# Altium footprint library con-molex.PCBLIB: 368 footprints (part 9 of 26) (continued)
## 52760-0479 [mm] (continued)
  region: -5.247,3.1 -5.548,3.1 -5.548,2.375 -5.247,2.375
  rectangle: -4.913,-3.1 -4.612,-2.375
  region: -4.612,3.1 -4.913,3.1 -4.913,2.375 -4.612,2.375
  rectangle: -4.278,-3.1 -3.977,-2.375
  region: -3.977,3.1 -4.278,3.1 -4.278,2.375 -3.977,2.375
  rectangle: -3.643,-3.1 -3.342,-2.375
  region: -3.342,3.1 -3.643,3.1 -3.643,2.375 -3.342,2.375
  rectangle: -3.008,-3.1 -2.707,-2.375
  region: -2.707,3.1 -3.008,3.1 -3.008,2.375 -2.707,2.375
  rectangle: -2.373,-3.1 -2.072,-2.375
  region: -2.072,3.1 -2.373,3.1 -2.373,2.375 -2.072,2.375
  rectangle: -1.738,-3.1 -1.437,-2.375
  region: -1.437,3.1 -1.738,3.1 -1.738,2.375 -1.437,2.375
  rectangle: -1.103,-3.1 -0.802,-2.375
  region: -0.802,3.1 -1.103,3.1 -1.103,2.375 -0.802,2.375
  rectangle: -0.468,-3.1 -0.167,-2.375
  region: -0.167,3.1 -0.468,3.1 -0.468,2.375 -0.167,2.375
  rectangle: 0.167,-3.1 0.468,-2.375
  region: 0.468,3.1 0.167,3.1 0.167,2.375 0.468,2.375
  rectangle: 0.802,-3.1 1.103,-2.375
  region: 1.103,3.1 0.802,3.1 0.802,2.375 1.103,2.375
  rectangle: 1.437,-3.1 1.738,-2.375
  region: 1.738,3.1 1.437,3.1 1.437,2.375 1.738,2.375
  rectangle: 2.072,-3.1 2.373,-2.375
  region: 2.373,3.1 2.072,3.1 2.072,2.375 2.373,2.375
  rectangle: 2.707,-3.1 3.008,-2.375
  region: 3.008,3.1 2.707,3.1 2.707,2.375 3.008,2.375
  rectangle: 3.342,-3.1 3.643,-2.375
  region: 3.643,3.1 3.342,3.1 3.342,2.375 3.643,2.375
  rectangle: 3.977,-3.1 4.278,-2.375
  region: 4.278,3.1 3.977,3.1 3.977,2.375 4.278,2.375
  rectangle: 4.612,-3.1 4.913,-2.375
  region: 4.913,3.1 4.612,3.1 4.612,2.375 4.913,2.375
  rectangle: 5.247,-3.1 5.548,-2.375
  region: 5.548,3.1 5.247,3.1 5.247,2.375 5.548,2.375
  rectangle: 5.882,-3.1 6.183,-2.375
  region: 6.183,3.1 5.882,3.1 5.882,2.375 6.183,2.375
  lines w0.203: -9.6,-1.5 -9.6,1.5 ; -8.2,-2.4 8.2,-2.4 ; -8.2,2.4 8.2,2.4 ; -6.6,-2 6.6,-2 ; -6.6,-1 6.6,-1 ; -6.6,1 6.6,1 ; -6.6,2 6.6,2 ; 9.6,-1.5 9.6,1.5

## 52760-0579 [mm]
pads (54):
  round 0.9 hole 0.9: 1(-9.273,0)
  rect 0.35x2.5 smd: 1(-7.62,-2.35) 2(-7.62,2.35) 3(-6.985,-2.35) 4(-6.985,2.35) 5(-6.35,-2.35) 6(-6.35,2.35) 7(-5.715,-2.35) 8(-5.715,2.35) 9(-5.08,-2.35) 10(-5.08,2.35) 11(-4.445,-2.35) 12(-4.445,2.35) 13(-3.81,-2.35) 14(-3.81,2.35) 15(-3.175,-2.35) 16(-3.175,2.35) 17(-2.54,-2.35) 18(-2.54,2.35) 19(-1.905,-2.35) 20(-1.905,2.35) 21(-1.27,-2.35) 22(-1.27,2.35) 23(-0.635,-2.35) 24(-0.635,2.35) 25(0,-2.35) 26(0,2.35) 27(0.635,-2.35) 28(0.635,2.35) 29(1.27,-2.35) 30(1.27,2.35) 31(1.905,-2.35) 32(1.905,2.35) 33(2.54,-2.35) 34(2.54,2.35) 35(3.175,-2.35) 36(3.175,2.35) 37(3.81,-2.35) 38(3.81,2.35) 39(4.445,-2.35) 40(4.445,2.35) 41(5.08,-2.35) 42(5.08,2.35) 43(5.715,-2.35) 44(5.715,2.35) 45(6.35,-2.35) 46(6.35,2.35) 47(6.985,-2.35) 48(6.985,2.35) 49(7.62,-2.35) 50(7.62,2.35)
  round 0.7 hole 0.7: 1(9.273,0)
  rect 2.5x2 smd: M1(-11.312,0) M2(11.312,0)
Top Overlay:
  lines w0.203: -11.187,-1.5 -11.787,-1.5 -11.787,-1.9 -10.587,-3.1 -9.787,-3.1 -9.787,-2.4 ; -11.187,1.5 -11.787,1.5 -11.787,3.1 -9.787,3.1 -9.787,2.4 ; -8.187,-2 -9.937,-2 -9.937,0 -9.187,0 -9.187,2 -8.187,2 ; -8.187,-1 cw(c-8.188,-0.75) -8.438,-0.75 -8.438,0.75 cw(c-8.188,0.75) -8.187,1 ; 8.187,-2 9.937,-2 9.937,0 9.187,0 9.187,2 8.187,2 ; 8.187,-1 ccw(c8.188,-0.75) 8.438,-0.75 8.438,0.75 ccw(c8.188,0.75) 8.187,1 ; 9.787,-2.4 9.787,-3.1 11.787,-3.1 11.787,-1.5 11.187,-1.5 ; 9.787,2.4 9.787,3.1 11.787,3.1 11.787,1.5 11.187,1.5
Top Solder:
  rectangle: -7.82,-3.625 -7.42,-1.075
  region: -7.42,3.625 -7.82,3.625 -7.82,1.075 -7.42,1.075
  rectangle: -7.185,-3.625 -6.785,-1.075
  region: -6.785,3.625 -7.185,3.625 -7.185,1.075 -6.785,1.075
  rectangle: -6.55,-3.625 -6.15,-1.075
  region: -6.15,3.625 -6.55,3.625 -6.55,1.075 -6.15,1.075
  rectangle: -5.915,-3.625 -5.515,-1.075
  region: -5.515,3.625 -5.915,3.625 -5.915,1.075 -5.515,1.075
  rectangle: -5.28,-3.625 -4.88,-1.075
  region: -4.88,3.625 -5.28,3.625 -5.28,1.075 -4.88,1.075
  rectangle: -4.645,-3.625 -4.245,-1.075
  region: -4.245,3.625 -4.645,3.625 -4.645,1.075 -4.245,1.075
  rectangle: -4.01,-3.625 -3.61,-1.075
  region: -3.61,3.625 -4.01,3.625 -4.01,1.075 -3.61,1.075
  rectangle: -3.375,-3.625 -2.975,-1.075
  region: -2.975,3.625 -3.375,3.625 -3.375,1.075 -2.975,1.075
  rectangle: -2.74,-3.625 -2.34,-1.075
  region: -2.34,3.625 -2.74,3.625 -2.74,1.075 -2.34,1.075
  rectangle: -2.105,-3.625 -1.705,-1.075
  region: -1.705,3.625 -2.105,3.625 -2.105,1.075 -1.705,1.075
  rectangle: -1.47,-3.625 -1.07,-1.075
  region: -1.07,3.625 -1.47,3.625 -1.47,1.075 -1.07,1.075
  rectangle: -0.835,-3.625 -0.435,-1.075
  region: -0.435,3.625 -0.835,3.625 -0.835,1.075 -0.435,1.075
  rectangle: -0.2,-3.625 0.2,-1.075
  region: 0.2,3.625 -0.2,3.625 -0.2,1.075 0.2,1.075
  rectangle: 0.435,-3.625 0.835,-1.075
  region: 0.835,3.625 0.435,3.625 0.435,1.075 0.835,1.075
  rectangle: 1.07,-3.625 1.47,-1.075
  region: 1.47,3.625 1.07,3.625 1.07,1.075 1.47,1.075
  rectangle: 1.705,-3.625 2.105,-1.075
  region: 2.105,3.625 1.705,3.625 1.705,1.075 2.105,1.075
  rectangle: 2.34,-3.625 2.74,-1.075
  region: 2.74,3.625 2.34,3.625 2.34,1.075 2.74,1.075
  rectangle: 2.975,-3.625 3.375,-1.075
  region: 3.375,3.625 2.975,3.625 2.975,1.075 3.375,1.075
  rectangle: 3.61,-3.625 4.01,-1.075
  region: 4.01,3.625 3.61,3.625 3.61,1.075 4.01,1.075
  rectangle: 4.245,-3.625 4.645,-1.075
  region: 4.645,3.625 4.245,3.625 4.245,1.075 4.645,1.075
  rectangle: 4.88,-3.625 5.28,-1.075
  region: 5.28,3.625 4.88,3.625 4.88,1.075 5.28,1.075
  rectangle: 5.515,-3.625 5.915,-1.075
  region: 5.915,3.625 5.515,3.625 5.515,1.075 5.915,1.075
  rectangle: 6.15,-3.625 6.55,-1.075
  region: 6.55,3.625 6.15,3.625 6.15,1.075 6.55,1.075
  rectangle: 6.785,-3.625 7.185,-1.075
  region: 7.185,3.625 6.785,3.625 6.785,1.075 7.185,1.075
  rectangle: 7.42,-3.625 7.82,-1.075
  region: 7.82,3.625 7.42,3.625 7.42,1.075 7.82,1.075
Mechanical 16:
  rectangle: -7.77,-3.1 -7.47,-2.375
  region: -7.47,3.1 -7.77,3.1 -7.77,2.375 -7.47,2.375
  rectangle: -7.135,-3.1 -6.835,-2.375
  region: -6.835,3.1 -7.135,3.1 -7.135,2.375 -6.835,2.375
  rectangle: -6.5,-3.1 -6.2,-2.375
  region: -6.2,3.1 -6.5,3.1 -6.5,2.375 -6.2,2.375
  rectangle: -5.865,-3.1 -5.565,-2.375
  region: -5.565,3.1 -5.865,3.1 -5.865,2.375 -5.565,2.375
  rectangle: -5.23,-3.1 -4.93,-2.375
  region: -4.93,3.1 -5.23,3.1 -5.23,2.375 -4.93,2.375
  rectangle: -4.595,-3.1 -4.295,-2.375
  region: -4.295,3.1 -4.595,3.1 -4.595,2.375 -4.295,2.375
  rectangle: -3.96,-3.1 -3.66,-2.375
  region: -3.66,3.1 -3.96,3.1 -3.96,2.375 -3.66,2.375
  rectangle: -3.325,-3.1 -3.025,-2.375
  region: -3.025,3.1 -3.325,3.1 -3.325,2.375 -3.025,2.375
  rectangle: -2.69,-3.1 -2.39,-2.375
  region: -2.39,3.1 -2.69,3.1 -2.69,2.375 -2.39,2.375
  rectangle: -2.055,-3.1 -1.755,-2.375
  region: -1.755,3.1 -2.055,3.1 -2.055,2.375 -1.755,2.375
  rectangle: -1.42,-3.1 -1.12,-2.375
  region: -1.12,3.1 -1.42,3.1 -1.42,2.375 -1.12,2.375
  rectangle: -0.785,-3.1 -0.485,-2.375
  region: -0.485,3.1 -0.785,3.1 -0.785,2.375 -0.485,2.375
  rectangle: -0.15,-3.1 0.15,-2.375
  region: 0.15,3.1 -0.15,3.1 -0.15,2.375 0.15,2.375
  rectangle: 0.485,-3.1 0.785,-2.375
  region: 0.785,3.1 0.485,3.1 0.485,2.375 0.785,2.375
  rectangle: 1.12,-3.1 1.42,-2.375
  region: 1.42,3.1 1.12,3.1 1.12,2.375 1.42,2.375
  rectangle: 1.755,-3.1 2.055,-2.375
  region: 2.055,3.1 1.755,3.1 1.755,2.375 2.055,2.375
  rectangle: 2.39,-3.1 2.69,-2.375
  region: 2.69,3.1 2.39,3.1 2.39,2.375 2.69,2.375
  rectangle: 3.025,-3.1 3.325,-2.375
  region: 3.325,3.1 3.025,3.1 3.025,2.375 3.325,2.375
  rectangle: 3.66,-3.1 3.96,-2.375
  region: 3.96,3.1 3.66,3.1 3.66,2.375 3.96,2.375
  rectangle: 4.295,-3.1 4.595,-2.375
  region: 4.595,3.1 4.295,3.1 4.295,2.375 4.595,2.375
  rectangle: 4.93,-3.1 5.23,-2.375
  region: 5.23,3.1 4.93,3.1 4.93,2.375 5.23,2.375
  rectangle: 5.565,-3.1 5.865,-2.375
  region: 5.865,3.1 5.565,3.1 5.565,2.375 5.865,2.375
  rectangle: 6.2,-3.1 6.5,-2.375
  region: 6.5,3.1 6.2,3.1 6.2,2.375 6.5,2.375
  rectangle: 6.835,-3.1 7.135,-2.375
  region: 7.135,3.1 6.835,3.1 6.835,2.375 7.135,2.375
  rectangle: 7.47,-3.1 7.77,-2.375
  region: 7.77,3.1 7.47,3.1 7.47,2.375 7.77,2.375
  lines w0.203: -11.187,-1.5 -11.187,1.5 ; -9.787,-2.4 9.787,-2.4 ; -9.787,2.4 9.787,2.4 ; -8.187,-2 8.187,-2 ; -8.187,-1 8.187,-1 ; -8.187,1 8.187,1 ; -8.187,2 8.187,2 ; 11.187,-1.5 11.187,1.5

## 52760-0679 [mm]
pads (64):
  round 0.9 hole 0.9: 1(-10.86,0)
  rect 0.35x2.5 smd: 1(-9.207,-2.35) 2(-9.207,2.35) 3(-8.572,-2.35) 4(-8.572,2.35) 5(-7.938,-2.35) 6(-7.938,2.35) 7(-7.302,-2.35) 8(-7.302,2.35) 9(-6.667,-2.35) 10(-6.667,2.35) 11(-6.032,-2.35) 12(-6.032,2.35) 13(-5.397,-2.35) 14(-5.397,2.35) 15(-4.763,-2.35) 16(-4.763,2.35) 17(-4.127,-2.35) 18(-4.127,2.35) 19(-3.492,-2.35) 20(-3.492,2.35) 21(-2.857,-2.35) 22(-2.857,2.35) 23(-2.222,-2.35) 24(-2.222,2.35) 25(-1.587,-2.35) 26(-1.587,2.35) 27(-0.953,-2.35) 28(-0.953,2.35) 29(-0.318,-2.35) 30(-0.318,2.35) 31(0.318,-2.35) 32(0.318,2.35) 33(0.953,-2.35) 34(0.953,2.35) 35(1.587,-2.35) 36(1.587,2.35) 37(2.222,-2.35) 38(2.222,2.35) 39(2.857,-2.35) 40(2.857,2.35) 41(3.492,-2.35) 42(3.492,2.35) 43(4.127,-2.35) 44(4.127,2.35) 45(4.763,-2.35) 46(4.763,2.35) 47(5.397,-2.35) 48(5.397,2.35) 49(6.032,-2.35) 50(6.032,2.35) 51(6.667,-2.35) 52(6.667,2.35) 53(7.302,-2.35) 54(7.302,2.35) 55(7.938,-2.35) 56(7.938,2.35) 57(8.572,-2.35) 58(8.572,2.35) 59(9.207,-2.35) 60(9.207,2.35)
  round 0.7 hole 0.7: 1(10.86,0)
  rect 2.5x2 smd: M1(-12.9,0) M2(12.9,0)
Top Overlay:
  lines w0.203: -12.775,-1.5 -13.375,-1.5 -13.375,-1.9 -12.175,-3.1 -11.375,-3.1 -11.375,-2.4 ; -12.775,1.5 -13.375,1.5 -13.375,3.1 -11.375,3.1 -11.375,2.4 ; -9.775,-2 -11.525,-2 -11.525,0 -10.775,0 -10.775,2 -9.775,2 ; -9.775,-1 cw(c-9.775,-0.75) -10.025,-0.75 -10.025,0.75 cw(c-9.775,0.75) -9.775,1 ; 9.775,-2 11.525,-2 11.525,0 10.775,0 10.775,2 9.775,2 ; 9.775,-1 ccw(c9.775,-0.75) 10.025,-0.75 10.025,0.75 ccw(c9.775,0.75) 9.775,1 ; 11.375,-2.4 11.375,-3.1 13.375,-3.1 13.375,-1.5 12.775,-1.5 ; 11.375,2.4 11.375,3.1 13.375,3.1 13.375,1.5 12.775,1.5
Top Solder:
  rectangle: -9.407,-3.625 -9.008,-1.075
  region: -9.008,3.625 -9.407,3.625 -9.407,1.075 -9.008,1.075
  rectangle: -8.772,-3.625 -8.373,-1.075
  region: -8.373,3.625 -8.772,3.625 -8.772,1.075 -8.373,1.075
  rectangle: -8.137,-3.625 -7.738,-1.075
  region: -7.738,3.625 -8.137,3.625 -8.137,1.075 -7.738,1.075
  rectangle: -7.502,-3.625 -7.103,-1.075
  region: -7.103,3.625 -7.502,3.625 -7.502,1.075 -7.103,1.075
  rectangle: -6.867,-3.625 -6.468,-1.075
  region: -6.468,3.625 -6.867,3.625 -6.867,1.075 -6.468,1.075
  rectangle: -6.232,-3.625 -5.833,-1.075
  region: -5.833,3.625 -6.232,3.625 -6.232,1.075 -5.833,1.075
  rectangle: -5.597,-3.625 -5.198,-1.075
  region: -5.198,3.625 -5.597,3.625 -5.597,1.075 -5.198,1.075
  rectangle: -4.962,-3.625 -4.563,-1.075
  region: -4.563,3.625 -4.962,3.625 -4.962,1.075 -4.563,1.075
  rectangle: -4.327,-3.625 -3.928,-1.075
  region: -3.928,3.625 -4.327,3.625 -4.327,1.075 -3.928,1.075
  rectangle: -3.692,-3.625 -3.293,-1.075
  region: -3.293,3.625 -3.692,3.625 -3.692,1.075 -3.293,1.075
  rectangle: -3.057,-3.625 -2.658,-1.075
  region: -2.658,3.625 -3.057,3.625 -3.057,1.075 -2.658,1.075
  rectangle: -2.422,-3.625 -2.023,-1.075
  region: -2.023,3.625 -2.422,3.625 -2.422,1.075 -2.023,1.075
  rectangle: -1.787,-3.625 -1.388,-1.075
  region: -1.388,3.625 -1.787,3.625 -1.787,1.075 -1.388,1.075
  rectangle: -1.152,-3.625 -0.753,-1.075
  region: -0.753,3.625 -1.152,3.625 -1.152,1.075 -0.753,1.075
  rectangle: -0.517,-3.625 -0.118,-1.075
  region: -0.118,3.625 -0.517,3.625 -0.517,1.075 -0.118,1.075
  rectangle: 0.118,-3.625 0.517,-1.075
  region: 0.517,3.625 0.118,3.625 0.118,1.075 0.517,1.075
  rectangle: 0.753,-3.625 1.152,-1.075
  region: 1.152,3.625 0.753,3.625 0.753,1.075 1.152,1.075
  rectangle: 1.388,-3.625 1.787,-1.075
  region: 1.787,3.625 1.388,3.625 1.388,1.075 1.787,1.075
  rectangle: 2.023,-3.625 2.422,-1.075
  region: 2.422,3.625 2.023,3.625 2.023,1.075 2.422,1.075
  rectangle: 2.658,-3.625 3.057,-1.075
  region: 3.057,3.625 2.658,3.625 2.658,1.075 3.057,1.075
  rectangle: 3.293,-3.625 3.692,-1.075
  region: 3.692,3.625 3.293,3.625 3.293,1.075 3.692,1.075
  rectangle: 3.928,-3.625 4.327,-1.075
  region: 4.327,3.625 3.928,3.625 3.928,1.075 4.327,1.075
  rectangle: 4.563,-3.625 4.962,-1.075
  region: 4.962,3.625 4.563,3.625 4.563,1.075 4.962,1.075
  rectangle: 5.198,-3.625 5.597,-1.075
  region: 5.597,3.625 5.198,3.625 5.198,1.075 5.597,1.075
  rectangle: 5.833,-3.625 6.232,-1.075
  region: 6.232,3.625 5.833,3.625 5.833,1.075 6.232,1.075
  rectangle: 6.468,-3.625 6.867,-1.075
  region: 6.867,3.625 6.468,3.625 6.468,1.075 6.867,1.075
  rectangle: 7.103,-3.625 7.502,-1.075
  region: 7.502,3.625 7.103,3.625 7.103,1.075 7.502,1.075
  rectangle: 7.738,-3.625 8.137,-1.075
  region: 8.137,3.625 7.738,3.625 7.738,1.075 8.137,1.075
  rectangle: 8.373,-3.625 8.772,-1.075
  region: 8.772,3.625 8.373,3.625 8.373,1.075 8.772,1.075
  rectangle: 9.008,-3.625 9.407,-1.075
  region: 9.407,3.625 9.008,3.625 9.008,1.075 9.407,1.075
Mechanical 16:
  rectangle: -9.358,-3.1 -9.057,-2.375
  region: -9.057,3.1 -9.358,3.1 -9.358,2.375 -9.057,2.375
  rectangle: -8.723,-3.1 -8.422,-2.375
  region: -8.422,3.1 -8.723,3.1 -8.723,2.375 -8.422,2.375
  rectangle: -8.088,-3.1 -7.787,-2.375
  region: -7.787,3.1 -8.088,3.1 -8.088,2.375 -7.787,2.375
  rectangle: -7.453,-3.1 -7.152,-2.375
  region: -7.152,3.1 -7.453,3.1 -7.453,2.375 -7.152,2.375
  rectangle: -6.818,-3.1 -6.517,-2.375
  region: -6.517,3.1 -6.818,3.1 -6.818,2.375 -6.517,2.375
  rectangle: -6.183,-3.1 -5.882,-2.375
  region: -5.882,3.1 -6.183,3.1 -6.183,2.375 -5.882,2.375
  rectangle: -5.548,-3.1 -5.247,-2.375
  region: -5.247,3.1 -5.548,3.1 -5.548,2.375 -5.247,2.375
  rectangle: -4.913,-3.1 -4.612,-2.375
  region: -4.612,3.1 -4.913,3.1 -4.913,2.375 -4.612,2.375
  rectangle: -4.278,-3.1 -3.977,-2.375
  region: -3.977,3.1 -4.278,3.1 -4.278,2.375 -3.977,2.375
  rectangle: -3.643,-3.1 -3.342,-2.375
  region: -3.342,3.1 -3.643,3.1 -3.643,2.375 -3.342,2.375
  rectangle: -3.008,-3.1 -2.707,-2.375
  region: -2.707,3.1 -3.008,3.1 -3.008,2.375 -2.707,2.375
  rectangle: -2.373,-3.1 -2.072,-2.375
  region: -2.072,3.1 -2.373,3.1 -2.373,2.375 -2.072,2.375
  rectangle: -1.738,-3.1 -1.437,-2.375
  region: -1.437,3.1 -1.738,3.1 -1.738,2.375 -1.437,2.375
  rectangle: -1.103,-3.1 -0.802,-2.375
  region: -0.802,3.1 -1.103,3.1 -1.103,2.375 -0.802,2.375
  rectangle: -0.468,-3.1 -0.167,-2.375
  region: -0.167,3.1 -0.468,3.1 -0.468,2.375 -0.167,2.375
  rectangle: 0.167,-3.1 0.468,-2.375
  region: 0.468,3.1 0.167,3.1 0.167,2.375 0.468,2.375
  rectangle: 0.802,-3.1 1.103,-2.375
  region: 1.103,3.1 0.802,3.1 0.802,2.375 1.103,2.375
  rectangle: 1.437,-3.1 1.738,-2.375
  region: 1.738,3.1 1.437,3.1 1.437,2.375 1.738,2.375
  rectangle: 2.072,-3.1 2.373,-2.375
  region: 2.373,3.1 2.072,3.1 2.072,2.375 2.373,2.375
  rectangle: 2.707,-3.1 3.008,-2.375
  region: 3.008,3.1 2.707,3.1 2.707,2.375 3.008,2.375
  rectangle: 3.342,-3.1 3.643,-2.375
  region: 3.643,3.1 3.342,3.1 3.342,2.375 3.643,2.375
  rectangle: 3.977,-3.1 4.278,-2.375
  region: 4.278,3.1 3.977,3.1 3.977,2.375 4.278,2.375
  rectangle: 4.612,-3.1 4.913,-2.375
  region: 4.913,3.1 4.612,3.1 4.612,2.375 4.913,2.375
  rectangle: 5.247,-3.1 5.548,-2.375
  region: 5.548,3.1 5.247,3.1 5.247,2.375 5.548,2.375
  rectangle: 5.882,-3.1 6.183,-2.375
  region: 6.183,3.1 5.882,3.1 5.882,2.375 6.183,2.375
  rectangle: 6.517,-3.1 6.818,-2.375
  region: 6.818,3.1 6.517,3.1 6.517,2.375 6.818,2.375
  rectangle: 7.152,-3.1 7.453,-2.375
  region: 7.453,3.1 7.152,3.1 7.152,2.375 7.453,2.375
  rectangle: 7.787,-3.1 8.088,-2.375
  region: 8.088,3.1 7.787,3.1 7.787,2.375 8.088,2.375
  rectangle: 8.422,-3.1 8.723,-2.375
  region: 8.723,3.1 8.422,3.1 8.422,2.375 8.723,2.375
  rectangle: 9.057,-3.1 9.358,-2.375
  region: 9.358,3.1 9.057,3.1 9.057,2.375 9.358,2.375
  lines w0.203: -12.775,-1.5 -12.775,1.5 ; -11.375,-2.4 11.375,-2.4 ; -11.375,2.4 11.375,2.4 ; -9.775,-2 9.775,-2 ; -9.775,-1 9.775,-1 ; -9.775,1 9.775,1 ; -9.775,2 9.775,2 ; 12.775,-1.5 12.775,1.5

## 52760-0779 [mm]
pads (74):
  round 0.9 hole 0.9: 1(-12.448,0)
  rect 0.35x2.5 smd: 1(-10.795,-2.35) 2(-10.795,2.35) 3(-10.16,-2.35) 4(-10.16,2.35) 5(-9.525,-2.35) 6(-9.525,2.35) 7(-8.89,-2.35) 8(-8.89,2.35) 9(-8.255,-2.35) 10(-8.255,2.35) 11(-7.62,-2.35) 12(-7.62,2.35) 13(-6.985,-2.35) 14(-6.985,2.35) 15(-6.35,-2.35) 16(-6.35,2.35) 17(-5.715,-2.35) 18(-5.715,2.35) 19(-5.08,-2.35) 20(-5.08,2.35) 21(-4.445,-2.35) 22(-4.445,2.35) 23(-3.81,-2.35) 24(-3.81,2.35) 25(-3.175,-2.35) 26(-3.175,2.35) 27(-2.54,-2.35) 28(-2.54,2.35) 29(-1.905,-2.35) 30(-1.905,2.35) 31(-1.27,-2.35) 32(-1.27,2.35) 33(-0.635,-2.35) 34(-0.635,2.35) 35(0,-2.35) 36(0,2.35) 37(0.635,-2.35) 38(0.635,2.35) 39(1.27,-2.35) 40(1.27,2.35) 41(1.905,-2.35) 42(1.905,2.35) 43(2.54,-2.35) 44(2.54,2.35) 45(3.175,-2.35) 46(3.175,2.35) 47(3.81,-2.35) 48(3.81,2.35) 49(4.445,-2.35) 50(4.445,2.35) 51(5.08,-2.35) 52(5.08,2.35) 53(5.715,-2.35) 54(5.715,2.35) 55(6.35,-2.35) 56(6.35,2.35) 57(6.985,-2.35) 58(6.985,2.35) 59(7.62,-2.35) 60(7.62,2.35) 61(8.255,-2.35) 62(8.255,2.35) 63(8.89,-2.35) 64(8.89,2.35) 65(9.525,-2.35) 66(9.525,2.35) 67(10.16,-2.35) 68(10.16,2.35) 69(10.795,-2.35) 70(10.795,2.35)
  round 0.7 hole 0.7: 1(12.448,0)
  rect 2.5x2 smd: M1(-14.487,0) M2(14.487,0)
Top Overlay:
  lines w0.203: -14.362,-1.5 -14.962,-1.5 -14.962,-1.9 -13.762,-3.1 -12.962,-3.1 -12.962,-2.4 ; -14.362,1.5 -14.962,1.5 -14.962,3.1 -12.962,3.1 -12.962,2.4 ; -11.362,-2 -13.112,-2 -13.112,0 -12.362,0 -12.362,2 -11.362,2 ; -11.362,-1 cw(c-11.363,-0.75) -11.613,-0.75 -11.613,0.75 cw(c-11.363,0.75) -11.362,1 ; 11.362,-2 13.112,-2 13.112,0 12.362,0 12.362,2 11.362,2 ; 11.362,-1 ccw(c11.363,-0.75) 11.613,-0.75 11.613,0.75 ccw(c11.363,0.75) 11.362,1 ; 12.962,-2.4 12.962,-3.1 14.962,-3.1 14.962,-1.5 14.362,-1.5 ; 12.962,2.4 12.962,3.1 14.962,3.1 14.962,1.5 14.362,1.5
Top Solder:
  rectangle: -10.995,-3.625 -10.595,-1.075
  region: -10.595,3.625 -10.995,3.625 -10.995,1.075 -10.595,1.075
  rectangle: -10.36,-3.625 -9.96,-1.075
  region: -9.96,3.625 -10.36,3.625 -10.36,1.075 -9.96,1.075
  rectangle: -9.725,-3.625 -9.325,-1.075
  region: -9.325,3.625 -9.725,3.625 -9.725,1.075 -9.325,1.075
  rectangle: -9.09,-3.625 -8.69,-1.075
  region: -8.69,3.625 -9.09,3.625 -9.09,1.075 -8.69,1.075
  rectangle: -8.455,-3.625 -8.055,-1.075
  region: -8.055,3.625 -8.455,3.625 -8.455,1.075 -8.055,1.075
  rectangle: -7.82,-3.625 -7.42,-1.075
  region: -7.42,3.625 -7.82,3.625 -7.82,1.075 -7.42,1.075
  rectangle: -7.185,-3.625 -6.785,-1.075
  region: -6.785,3.625 -7.185,3.625 -7.185,1.075 -6.785,1.075
  rectangle: -6.55,-3.625 -6.15,-1.075
  region: -6.15,3.625 -6.55,3.625 -6.55,1.075 -6.15,1.075
  rectangle: -5.915,-3.625 -5.515,-1.075
  region: -5.515,3.625 -5.915,3.625 -5.915,1.075 -5.515,1.075
  rectangle: -5.28,-3.625 -4.88,-1.075
  region: -4.88,3.625 -5.28,3.625 -5.28,1.075 -4.88,1.075
  rectangle: -4.645,-3.625 -4.245,-1.075
  region: -4.245,3.625 -4.645,3.625 -4.645,1.075 -4.245,1.075
  rectangle: -4.01,-3.625 -3.61,-1.075
  region: -3.61,3.625 -4.01,3.625 -4.01,1.075 -3.61,1.075
  rectangle: -3.375,-3.625 -2.975,-1.075
  region: -2.975,3.625 -3.375,3.625 -3.375,1.075 -2.975,1.075
  rectangle: -2.74,-3.625 -2.34,-1.075
  region: -2.34,3.625 -2.74,3.625 -2.74,1.075 -2.34,1.075
  rectangle: -2.105,-3.625 -1.705,-1.075
  region: -1.705,3.625 -2.105,3.625 -2.105,1.075 -1.705,1.075
  rectangle: -1.47,-3.625 -1.07,-1.075
  region: -1.07,3.625 -1.47,3.625 -1.47,1.075 -1.07,1.075
  rectangle: -0.835,-3.625 -0.435,-1.075
  region: -0.435,3.625 -0.835,3.625 -0.835,1.075 -0.435,1.075
  rectangle: -0.2,-3.625 0.2,-1.075
  region: 0.2,3.625 -0.2,3.625 -0.2,1.075 0.2,1.075
  rectangle: 0.435,-3.625 0.835,-1.075
  region: 0.835,3.625 0.435,3.625 0.435,1.075 0.835,1.075
  rectangle: 1.07,-3.625 1.47,-1.075
  region: 1.47,3.625 1.07,3.625 1.07,1.075 1.47,1.075
  rectangle: 1.705,-3.625 2.105,-1.075
  region: 2.105,3.625 1.705,3.625 1.705,1.075 2.105,1.075
  rectangle: 2.34,-3.625 2.74,-1.075
  region: 2.74,3.625 2.34,3.625 2.34,1.075 2.74,1.075
  rectangle: 2.975,-3.625 3.375,-1.075
  region: 3.375,3.625 2.975,3.625 2.975,1.075 3.375,1.075
  rectangle: 3.61,-3.625 4.01,-1.075
  region: 4.01,3.625 3.61,3.625 3.61,1.075 4.01,1.075
  rectangle: 4.245,-3.625 4.645,-1.075
  region: 4.645,3.625 4.245,3.625 4.245,1.075 4.645,1.075
  rectangle: 4.88,-3.625 5.28,-1.075
  region: 5.28,3.625 4.88,3.625 4.88,1.075 5.28,1.075
  rectangle: 5.515,-3.625 5.915,-1.075
  region: 5.915,3.625 5.515,3.625 5.515,1.075 5.915,1.075
  rectangle: 6.15,-3.625 6.55,-1.075
  region: 6.55,3.625 6.15,3.625 6.15,1.075 6.55,1.075
  rectangle: 6.785,-3.625 7.185,-1.075
  region: 7.185,3.625 6.785,3.625 6.785,1.075 7.185,1.075
  rectangle: 7.42,-3.625 7.82,-1.075
  region: 7.82,3.625 7.42,3.625 7.42,1.075 7.82,1.075
  rectangle: 8.055,-3.625 8.455,-1.075
  region: 8.455,3.625 8.055,3.625 8.055,1.075 8.455,1.075
  rectangle: 8.69,-3.625 9.09,-1.075
  region: 9.09,3.625 8.69,3.625 8.69,1.075 9.09,1.075
  rectangle: 9.325,-3.625 9.725,-1.075
  region: 9.725,3.625 9.325,3.625 9.325,1.075 9.725,1.075
  rectangle: 9.96,-3.625 10.36,-1.075
  region: 10.36,3.625 9.96,3.625 9.96,1.075 10.36,1.075
  rectangle: 10.595,-3.625 10.995,-1.075
  region: 10.995,3.625 10.595,3.625 10.595,1.075 10.995,1.075
Mechanical 16:
  rectangle: -10.945,-3.1 -10.645,-2.375
  region: -10.645,3.1 -10.945,3.1 -10.945,2.375 -10.645,2.375
  rectangle: -10.31,-3.1 -10.01,-2.375
  region: -10.01,3.1 -10.31,3.1 -10.31,2.375 -10.01,2.375
  rectangle: -9.675,-3.1 -9.375,-2.375
  region: -9.375,3.1 -9.675,3.1 -9.675,2.375 -9.375,2.375
  rectangle: -9.04,-3.1 -8.74,-2.375
  region: -8.74,3.1 -9.04,3.1 -9.04,2.375 -8.74,2.375
  rectangle: -8.405,-3.1 -8.105,-2.375
  region: -8.105,3.1 -8.405,3.1 -8.405,2.375 -8.105,2.375
  rectangle: -7.77,-3.1 -7.47,-2.375
  region: -7.47,3.1 -7.77,3.1 -7.77,2.375 -7.47,2.375
  rectangle: -7.135,-3.1 -6.835,-2.375
  region: -6.835,3.1 -7.135,3.1 -7.135,2.375 -6.835,2.375
  rectangle: -6.5,-3.1 -6.2,-2.375
  region: -6.2,3.1 -6.5,3.1 -6.5,2.375 -6.2,2.375
  rectangle: -5.865,-3.1 -5.565,-2.375
  region: -5.565,3.1 -5.865,3.1 -5.865,2.375 -5.565,2.375
  rectangle: -5.23,-3.1 -4.93,-2.375
  region: -4.93,3.1 -5.23,3.1 -5.23,2.375 -4.93,2.375
  rectangle: -4.595,-3.1 -4.295,-2.375
  region: -4.295,3.1 -4.595,3.1 -4.595,2.375 -4.295,2.375
  rectangle: -3.96,-3.1 -3.66,-2.375
  region: -3.66,3.1 -3.96,3.1 -3.96,2.375 -3.66,2.375
  rectangle: -3.325,-3.1 -3.025,-2.375
  region: -3.025,3.1 -3.325,3.1 -3.325,2.375 -3.025,2.375
  rectangle: -2.69,-3.1 -2.39,-2.375
  region: -2.39,3.1 -2.69,3.1 -2.69,2.375 -2.39,2.375
  rectangle: -2.055,-3.1 -1.755,-2.375
  region: -1.755,3.1 -2.055,3.1 -2.055,2.375 -1.755,2.375
  rectangle: -1.42,-3.1 -1.12,-2.375
  region: -1.12,3.1 -1.42,3.1 -1.42,2.375 -1.12,2.375
  rectangle: -0.785,-3.1 -0.485,-2.375
  region: -0.485,3.1 -0.785,3.1 -0.785,2.375 -0.485,2.375
  rectangle: -0.15,-3.1 0.15,-2.375
  region: 0.15,3.1 -0.15,3.1 -0.15,2.375 0.15,2.375
  rectangle: 0.485,-3.1 0.785,-2.375
  region: 0.785,3.1 0.485,3.1 0.485,2.375 0.785,2.375
  rectangle: 1.12,-3.1 1.42,-2.375
  region: 1.42,3.1 1.12,3.1 1.12,2.375 1.42,2.375
  rectangle: 1.755,-3.1 2.055,-2.375
  region: 2.055,3.1 1.755,3.1 1.755,2.375 2.055,2.375
  rectangle: 2.39,-3.1 2.69,-2.375
  region: 2.69,3.1 2.39,3.1 2.39,2.375 2.69,2.375
  rectangle: 3.025,-3.1 3.325,-2.375
  region: 3.325,3.1 3.025,3.1 3.025,2.375 3.325,2.375
  rectangle: 3.66,-3.1 3.96,-2.375
  region: 3.96,3.1 3.66,3.1 3.66,2.375 3.96,2.375
  rectangle: 4.295,-3.1 4.595,-2.375
  region: 4.595,3.1 4.295,3.1 4.295,2.375 4.595,2.375
  rectangle: 4.93,-3.1 5.23,-2.375
  region: 5.23,3.1 4.93,3.1 4.93,2.375 5.23,2.375
  rectangle: 5.565,-3.1 5.865,-2.375
  region: 5.865,3.1 5.565,3.1 5.565,2.375 5.865,2.375
  rectangle: 6.2,-3.1 6.5,-2.375
  region: 6.5,3.1 6.2,3.1 6.2,2.375 6.5,2.375
  rectangle: 6.835,-3.1 7.135,-2.375
  region: 7.135,3.1 6.835,3.1 6.835,2.375 7.135,2.375
  rectangle: 7.47,-3.1 7.77,-2.375
  region: 7.77,3.1 7.47,3.1 7.47,2.375 7.77,2.375
  rectangle: 8.105,-3.1 8.405,-2.375
  region: 8.405,3.1 8.105,3.1 8.105,2.375 8.405,2.375
  rectangle: 8.74,-3.1 9.04,-2.375
  region: 9.04,3.1 8.74,3.1 8.74,2.375 9.04,2.375
  rectangle: 9.375,-3.1 9.675,-2.375
  region: 9.675,3.1 9.375,3.1 9.375,2.375 9.675,2.375
  rectangle: 10.01,-3.1 10.31,-2.375
  region: 10.31,3.1 10.01,3.1 10.01,2.375 10.31,2.375
  rectangle: 10.645,-3.1 10.945,-2.375
  region: 10.945,3.1 10.645,3.1 10.645,2.375 10.945,2.375
  lines w0.203: -14.362,-1.5 -14.362,1.5 ; -12.962,-2.4 12.962,-2.4 ; -12.962,2.4 12.962,2.4 ; -11.362,-2 11.362,-2 ; -11.362,-1 11.362,-1 ; -11.362,1 11.362,1 ; -11.362,2 11.362,2 ; 14.362,-1.5 14.362,1.5